# Altium footprint library 6-Connectors-6.PcbLib: 117 footprints (part 3 of 8)
Each footprint in its own frame and in the unit in brackets; x right, y up, seen from the top. Pads: shape width x height; smd on the part's side, far side on the other; paste and mask are expansions set on the pad; w line width, h text height; cw(c..) or ccw(c..) is an arc to the next point about the centre after c.
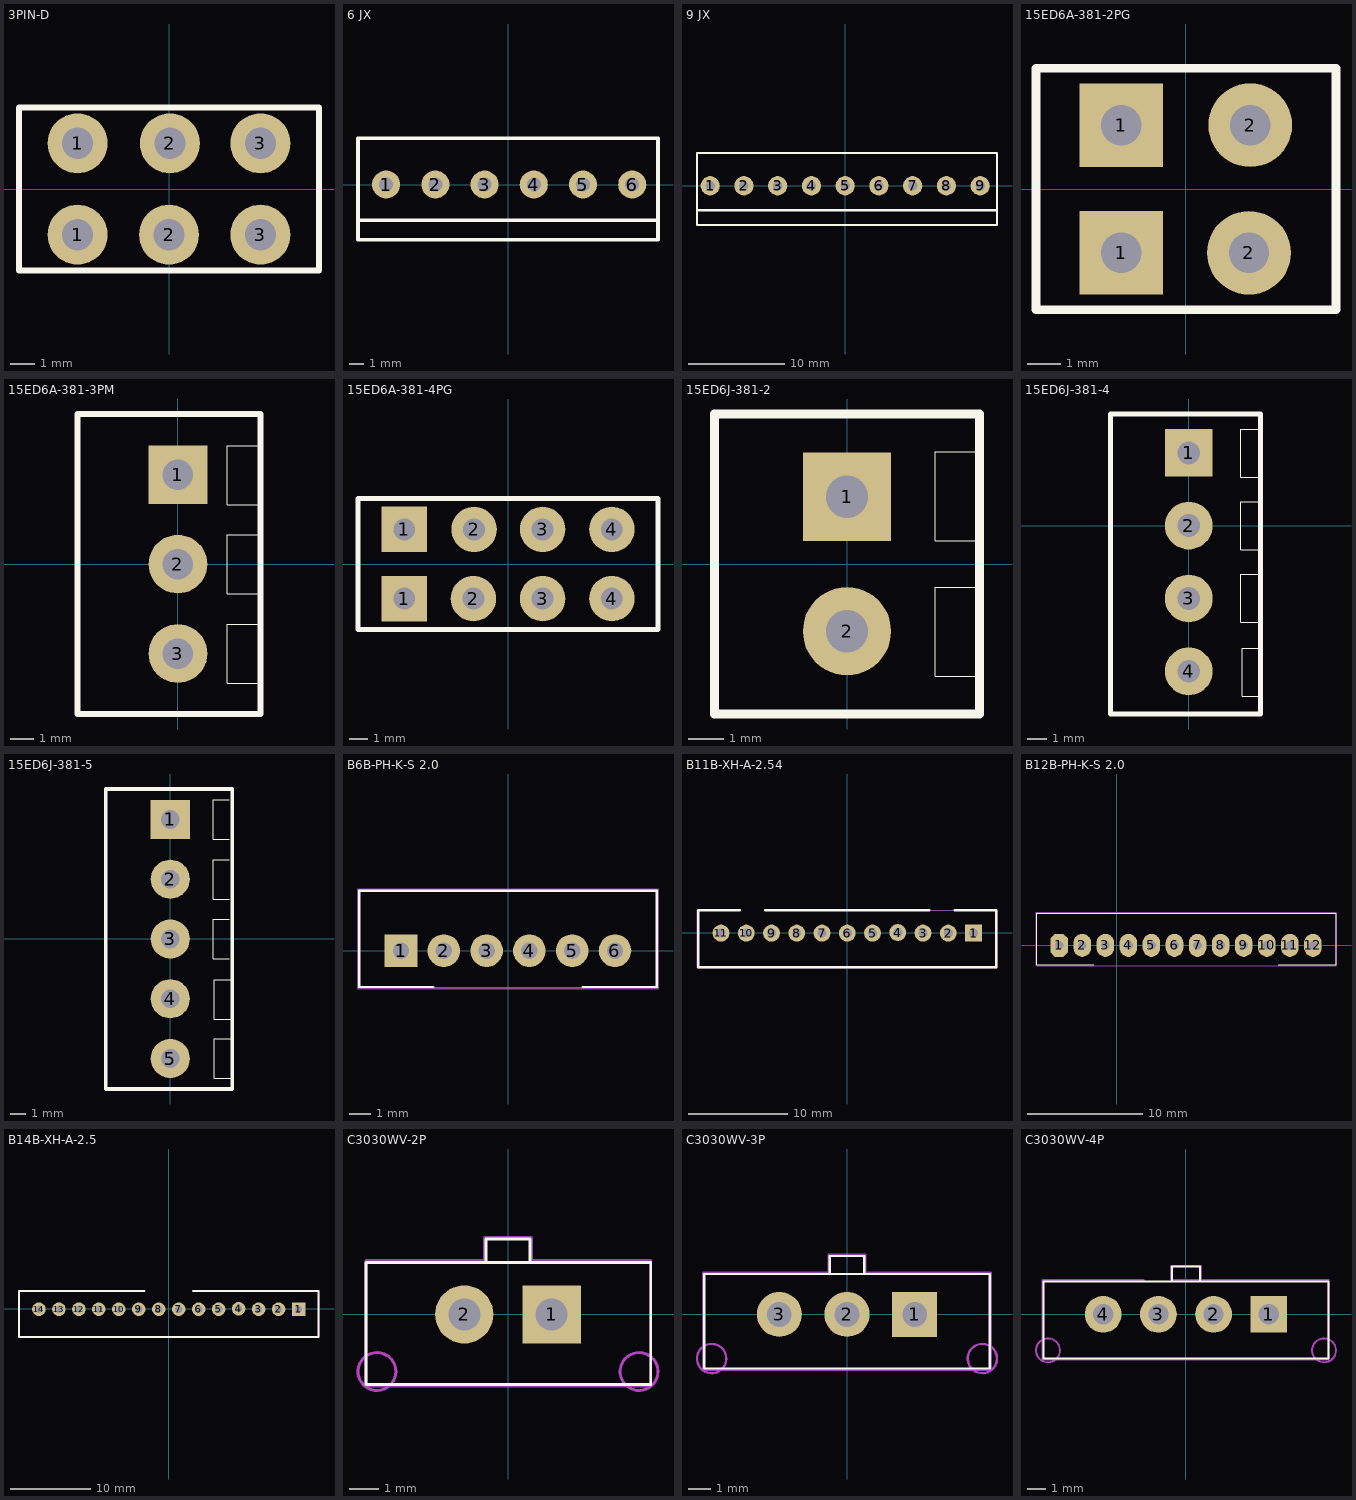
[diagram p2: the footprints below, top view; thin cyan lines are the x and y axes]

## 3PIN-D [mm]
height 7
pads (6):
  round 2.5 hole 1.3 mask+0.07: 1(-3.81,-1.905) 1(-3.81,1.905) 2(0.038,1.905) 3(3.81,-1.905) 3(3.81,1.905)
  round 2.5 hole 1.3: 2(0,-1.905)
Top Overlay:
  lines w0.254: -6.25,-3.4 -6.25,3.4 6.25,3.4 6.25,-3.4 -6.25,-3.4

## 6 JX [mm]
height 7
pads (6):
  round 2 hole 1: 1(-8.666,0)
  round 2 hole 1 mask+0.07: 2(-5.166,0) 3(-1.666,0) 4(1.834,0) 5(5.334,0) 6(8.834,0)
Top Overlay:
  lines w0.254: -10.668,-2.54 10.668,-2.54 ; -10.668,-3.937 10.668,-3.937 10.668,3.302 -10.668,3.302 -10.668,-3.937
3D body "3-jx.stp": height 8.3, standoff -4.2, extent 0,-3.81 10.5,3.19
3D body "3-jx.stp": height 8.3, standoff -4.2, extent -10.5,-3.81 0,3.19

## 9 JX [mm]
height 7
pads (9):
  round 2 hole 1 mask+0.07: 1(-14,0) 2(-10.5,0) 3(-7,0) 4(-3.5,0) 6(3.5,0) 7(7,0) 8(10.5,0) 9(14,0)
  round 2 hole 1: 5(0,0)
Top Overlay:
  lines w0.254: -15.367,-2.54 15.748,-2.54 ; -15.367,-4.064 -15.367,3.4 15.748,3.4 15.748,-4.064 -15.367,-4.064
3D body "3-jx.stp": height 8.3, standoff -4.2, extent -15.791,-3.825 -5.291,3.175
3D body "3-jx.stp": height 8.3, standoff -4.2, extent 5.291,-3.825 15.791,3.175
3D body "3-jx.stp": height 8.3, standoff -4.2, extent -5.25,-3.825 5.25,3.175

## 15ED6A-381-2PG [mm]
height 7
pads (4):
  rect 2.5x2.5 hole 1.2 mask+0.07: 1(-1.924,-1.905)
  rect 2.5x2.5 hole 1.2: 1(-1.924,1.905)
  round 2.5 hole 1.2 mask+0.07: 2(1.886,-1.905) 2(1.924,1.905)
Top Overlay:
  lines w0.254: -4.47,-3.607 4.483,-3.607 4.483,3.607 -4.47,3.607 -4.47,-3.607
3D body "15ed61-381-2pg.stp": height 14.65, standoff -3, extent -4.25,-3.4 4.25,3.4

## 15ED6A-381-3PM [mm]
height 7
pads (3):
  rect 2.5x2.5 hole 1.3 mask+0.07: 1(0,3.81)
  round 2.5 hole 1.3: 2(0,0)
  round 2.5 hole 1.3 mask+0.07: 3(0,-3.81)
Top Overlay:
  lines w0.02: 3.524,-5.067 2.095,-5.067 2.095,-2.553 3.524,-2.553 ; 3.524,-1.27 2.095,-1.27 2.095,1.245 3.524,1.245 ; 3.524,2.54 2.095,2.54 2.095,5.055 3.524,5.055
  lines w0.254: -4.286,-6.388 -4.286,6.401 3.524,6.401 3.524,-6.388 -4.286,-6.388
3D body "15ed6a-381-2pm.stp": height 9.25, standoff -3.2, extent -4.025,-2.345 3.225,6.155
3D body "15ed6a-381-2pm.stp": height 9.25, standoff -3.2, extent -4.024,-6.185 3.227,2.315

## 15ED6A-381-4PG [mm]
height 7
pads (8):
  rect 2.5x2.5 hole 1.2 mask+0.07: 1(-5.715,-1.905)
  rect 2.5x2.5 hole 1.2: 1(-5.715,1.905)
  round 2.5 hole 1.2 mask+0.07: 2(-1.905,-1.905) 2(-1.867,1.905) 3(1.905,-1.905) 3(1.905,1.905) 4(5.715,-1.905) 4(5.715,1.905)
Top Overlay:
  lines w0.254: -8.255,-3.607 -8.255,3.607 8.255,3.607 8.255,-3.607 -8.255,-3.607
3D body "15ed61-381-2pg.stp": height 14.65, standoff -3, extent -8.041,-3.4 0.459,3.4
3D body "15ed61-381-2pg.stp": height 14.65, standoff -3, extent -0.484,-3.4 8.016,3.4

## 15ED6J-381-2 [mm]
height 7
pads (2):
  rect 2.5x2.5 hole 1.2 mask+0.07: 1(0,1.905)
  round 2.5 hole 1.2: 2(0,-1.905)
Top Overlay:
  lines w0.02: 3.75,-3.175 2.495,-3.175 2.495,-0.66 3.75,-0.66 ; 3.75,0.66 2.495,0.66 2.495,3.175 3.75,3.175
  lines w0.254: -3.75,-4.25 -3.75,4.25 3.75,4.25 3.75,-4.25 -3.75,-4.25
3D body "15ed6a-381-2pm.stp": height 9.25, standoff -3.2, extent -3.625,-4.25 3.625,4.25

## 15ED6J-381-4 [mm]
height 7
pads (4):
  rect 2.5x2.5 hole 1.2 mask+0.07: 1(0,3.81)
  round 2.5 hole 1.2 mask+0.07: 2(0,0) 3(0,-3.81)
  round 2.5 hole 1.2: 4(0,-7.62)
Top Overlay:
  lines w0.02: 3.75,-5.067 2.73,-5.067 2.73,-2.553 3.75,-2.553 ; 3.75,-1.27 2.73,-1.27 2.73,1.245 3.75,1.245 ; 3.75,2.54 2.73,2.54 2.73,5.055 3.75,5.055 ; 3.814,-8.928 2.794,-8.928 2.794,-6.413 3.814,-6.413
  lines w0.254: -4.102,-9.855 -4.102,5.842 3.75,5.842 3.75,-9.855 -4.102,-9.855
3D body "dg381-3_81-3.stp": height 8.6, standoff -3.42, extent -3.869,-1.994 3.531,5.626
3D body "dg381-3_81-3.stp": height 8.6, standoff -3.42, extent -3.869,-9.614 3.531,-1.994

## 15ED6J-381-5 [mm]
height 7
pads (5):
  rect 2.5x2.5 hole 1.2 mask+0.07: 1(0,7.62)
  round 2.5 hole 1.2 mask+0.07: 2(0,3.81) 3(0,0) 4(0,-3.81)
  round 2.5 hole 1.2: 5(0,-7.62)
Top Overlay:
  lines w0.02: 3.75,-1.257 2.73,-1.257 2.73,1.257 3.75,1.257 ; 3.75,2.54 2.73,2.54 2.73,5.055 3.75,5.055 ; 3.75,6.35 2.73,6.35 2.73,8.865 3.75,8.865 ; 3.814,-8.89 2.794,-8.89 2.794,-6.375 3.814,-6.375 ; 3.814,-5.118 2.794,-5.118 2.794,-2.603 3.814,-2.603
  lines w0.254: -4.115,-9.563 3.95,-9.563 3.95,9.56 -4.115,9.56 -4.115,-9.563
3D body "dg381-3_81-3.stp": height 8.6, standoff -3.42, extent -3.793,1.88 3.607,9.5
3D body "dg381-3_81-3.stp": height 8.6, standoff -3.42, extent -3.793,-5.74 3.607,1.88
3D body "dg381-3_81-3.stp": height 8.6, standoff -3.42, extent -3.793,-9.385 3.607,-1.765

## B6B-PH-K-S 2.0 [mil]
height 574.8
pads (6):
  rect 60x60 hole 30: 1(-196.85,0)
  round 60 hole 30: 2(-118.11,0) 3(-39.37,0) 4(39.37,0) 5(118.11,0) 6(196.85,0)
Top Overlay:
  lines w3.94: -136.81,-66.93 -273.62,-66.93 -273.62,110.24 273.62,110.24 273.62,-66.93 136.81,-66.93
Mechanical 15:
  lines w3.94: -276,-69 276,-69 276,112 -276,112 -276,-69
3D body "b6b-ph-k-s.stp": height 236.22, standoff -98.43, extent -274.62,-67.58 272.63,109.58

## B11B-XH-A-2.54 [mm]
height 14.6
pads (11):
  rect 1.7x1.7 hole 0.9: 1(12.7,-0.03)
  round 1.7 hole 0.9 mask+0.07: 2(10.16,-0.03) 3(7.62,-0.03) 5(2.54,-0.03) 6(0,-0.03) 8(-5.08,-0.03) 9(-7.62,-0.03) 11(-12.7,-0.03)
  round 1.7 hole 0.9: 4(5.08,0.03) 7(-2.54,-0.03) 10(-10.16,-0.03)
Top Overlay:
  lines w0.254: -10.795,2.27 -14.986,2.27 -14.986,-3.48 14.986,-3.48 14.986,2.27 10.795,2.27 ; -8.255,2.286 8.255,2.286
Mechanical 15:
  lines w0.03: -14.769,2.27 -15.113,2.27 -15.113,-3.53 15.057,-3.53 15.057,2.27 -0.333,2.27

## B12B-PH-K-S 2.0 [mm]
height 14.6
pads (12):
  oct 1.524x2 hole 0.762: 1(-5,0)
  oval 1.524x2 hole 0.762: 2(-3,0) 3(-1,0) 4(1,0) 5(3,0) 6(5,0) 7(7,0) 8(9,0) 9(11,0) 10(13,0) 11(15,0) 12(17,0)
Top Overlay:
  lines w0.1: -2,-1.7 -6.95,-1.7 -6.95,2.8 19,2.8 19,-1.7 14,-1.7
Mechanical 15:
  lines w0.1: -7.01,-1.753 19,-1.753 19,2.845 -7.01,2.845 -7.01,-1.753
3D body "s12b-ph-k-s.stp": height 6, standoff -3.3, extent -6.925,-1.7 18.975,2.8

## B14B-XH-A-2.5 [mm]
height 14.6
pads (14):
  rect 1.7x1.7 hole 0.9: 1(16.244,-0.03)
  round 1.7 hole 0.9 mask+0.07: 2(13.744,-0.03) 3(11.244,-0.03) 5(6.244,-0.03) 6(3.744,-0.03) 8(-1.256,-0.03) 9(-3.756,-0.03) 11(-8.757,-0.03) 12(-11.244,-0.03) 13(-13.744,-0.03) 14(-16.244,-0.03)
  round 1.7 hole 0.9: 4(8.744,0.03) 7(1.244,-0.03) 10(-6.257,-0.03)
Top Overlay:
  lines w0.254: -3.042,2.27 -18.744,2.27 -18.744,-3.48 18.757,-3.48 18.757,2.27 3.054,2.27
Mechanical 15:
  lines w0.03: -11.025,2.27 -18.744,2.27 -18.744,-3.53 18.8,-3.53 18.8,2.27 3.41,2.27
3D body "b14b-xh-a.stp": height 7, standoff -3.5, extent -18.693,-3.48 18.707,2.27

## C3030WV-2P [mm]
height 14.6
pads (2):
  rect 2x2 hole 1.1: 1(1.5,0)
  round 2 hole 1.1: 2(-1.5,0)
Top Overlay:
  lines w0.1: -0.762,1.79 -0.762,2.591 0.762,2.591 0.762,1.79 ; -4.877,-2.4 4.902,-2.4 4.902,1.79 -4.877,1.79 -4.877,-2.4
Keep-Out Layer:
  circle w0.1: c4.5,-1.96 r0.65
  circle w0.1: c-4.5,-1.96 r0.65
Mechanical 1:
  circle w0.1: c4.5,-1.96 r0.65
  circle w0.1: c-4.5,-1.96 r0.65
Mechanical 11:
  lines w0.1: -4.877,-2.464 -4.877,1.854 -0.813,1.854 -0.813,2.642 0.813,2.642 0.813,1.854 4.902,1.854 4.902,-2.464 -4.877,-2.464
3D body "2-2-1f.stp": height 0.35, standoff -1.85, extent 0.5,-1 2.5,1
3D body "2-2_1.stp": height 0.35, standoff -1.85, extent -2.5,-0.999 -0.5,0.999
3D body "c3030wv-2p.stp": height 9.9, standoff -3, extent -4.8,-2.312 4.85,2.658

## C3030WV-3P [mm]
height 14.6
pads (3):
  rect 2x2 hole 1.1: 1(3,0)
  round 2 hole 1.1: 2(0,0) 3(-3,0)
Top Overlay:
  lines w0.1: -0.762,1.79 -0.762,2.591 0.762,2.591 0.762,1.79 ; -6.325,-2.4 6.325,-2.4 6.325,1.79 -6.325,1.79 -6.325,-2.4
Keep-Out Layer:
  circle w0.1: c6,-1.96 r0.65
  circle w0.1: c-6,-1.96 r0.65
Mechanical 1:
  circle w0.1: c6,-1.96 r0.65
  circle w0.1: c-6,-1.96 r0.65
Mechanical 11:
  lines w0.1: -6.375,-2.464 -6.375,1.854 -0.813,1.854 -0.813,2.642 0.813,2.642 0.813,1.854 6.375,1.854 6.375,-2.464 -6.375,-2.464
3D body "2-2_1.stp": height 0.35, standoff -1.85, extent -1,-0.999 1,0.999
3D body "c3030wv-3p.stp": height 9.9, standoff -3, extent -6.325,-2.515 6.325,2.655
3D body "2-2_1.stp": height 0.35, standoff -1.85, extent -4,-0.999 -2,0.999
3D body "2-2-1f.stp": height 0.35, standoff -1.85, extent 2,-1 4,1

## C3030WV-4P [mm]
height 14.6
pads (4):
  rect 2x2 hole 1.1: 1(4.5,0)
  round 2 hole 1.1: 2(1.5,0) 3(-1.5,0) 4(-4.5,0)
Top Overlay:
  lines w0.1: -0.762,1.79 -0.762,2.591 0.762,2.591 0.762,1.79 ; -7.75,-2.4 -7.75,1.79 7.75,1.79 7.75,-2.4 -7.75,-2.4
Keep-Out Layer:
  circle w0.1: c7.5,-1.96 r0.65
  circle w0.1: c-7.5,-1.96 r0.65
Mechanical 1:
  circle w0.1: c7.5,-1.96 r0.65
  circle w0.1: c-7.5,-1.96 r0.65
Mechanical 11:
  lines w0.1: -2.313,1.854 -7.798,1.854 -7.798,-2.464 7.75,-2.464 7.75,1.854 -0.687,1.854 ; -0.813,1.854 -0.813,2.642 0.813,2.642 0.813,1.854
3D body "2-2-1f.stp": height 0.35, standoff -1.85, extent 3.5,-1 5.5,1
3D body "2-2_1.stp": height 0.35, standoff -1.85, extent 0.5,-0.999 2.5,0.999
3D body "c3030wv-4p.stp": height 9.9, standoff -2.5, extent -7.825,-2.49 7.825,2.88
3D body "2-2_1.stp": height 0.35, standoff -1.85, extent -2.5,-0.999 -0.5,0.999
3D body "2-2_1.stp": height 0.35, standoff -1.85, extent -5.5,-0.999 -3.5,0.999